# Altium footprint library SMD_Bauteile.PcbLib: 355 footprints (part 16 of 23)
Each footprint in its own frame and in the unit in brackets; x right, y up, seen from the top. Pads: shape width x height; smd on the part's side, far side on the other; paste and mask are expansions set on the pad; w line width, h text height; cw(c..) or ccw(c..) is an arc to the next point about the centre after c.
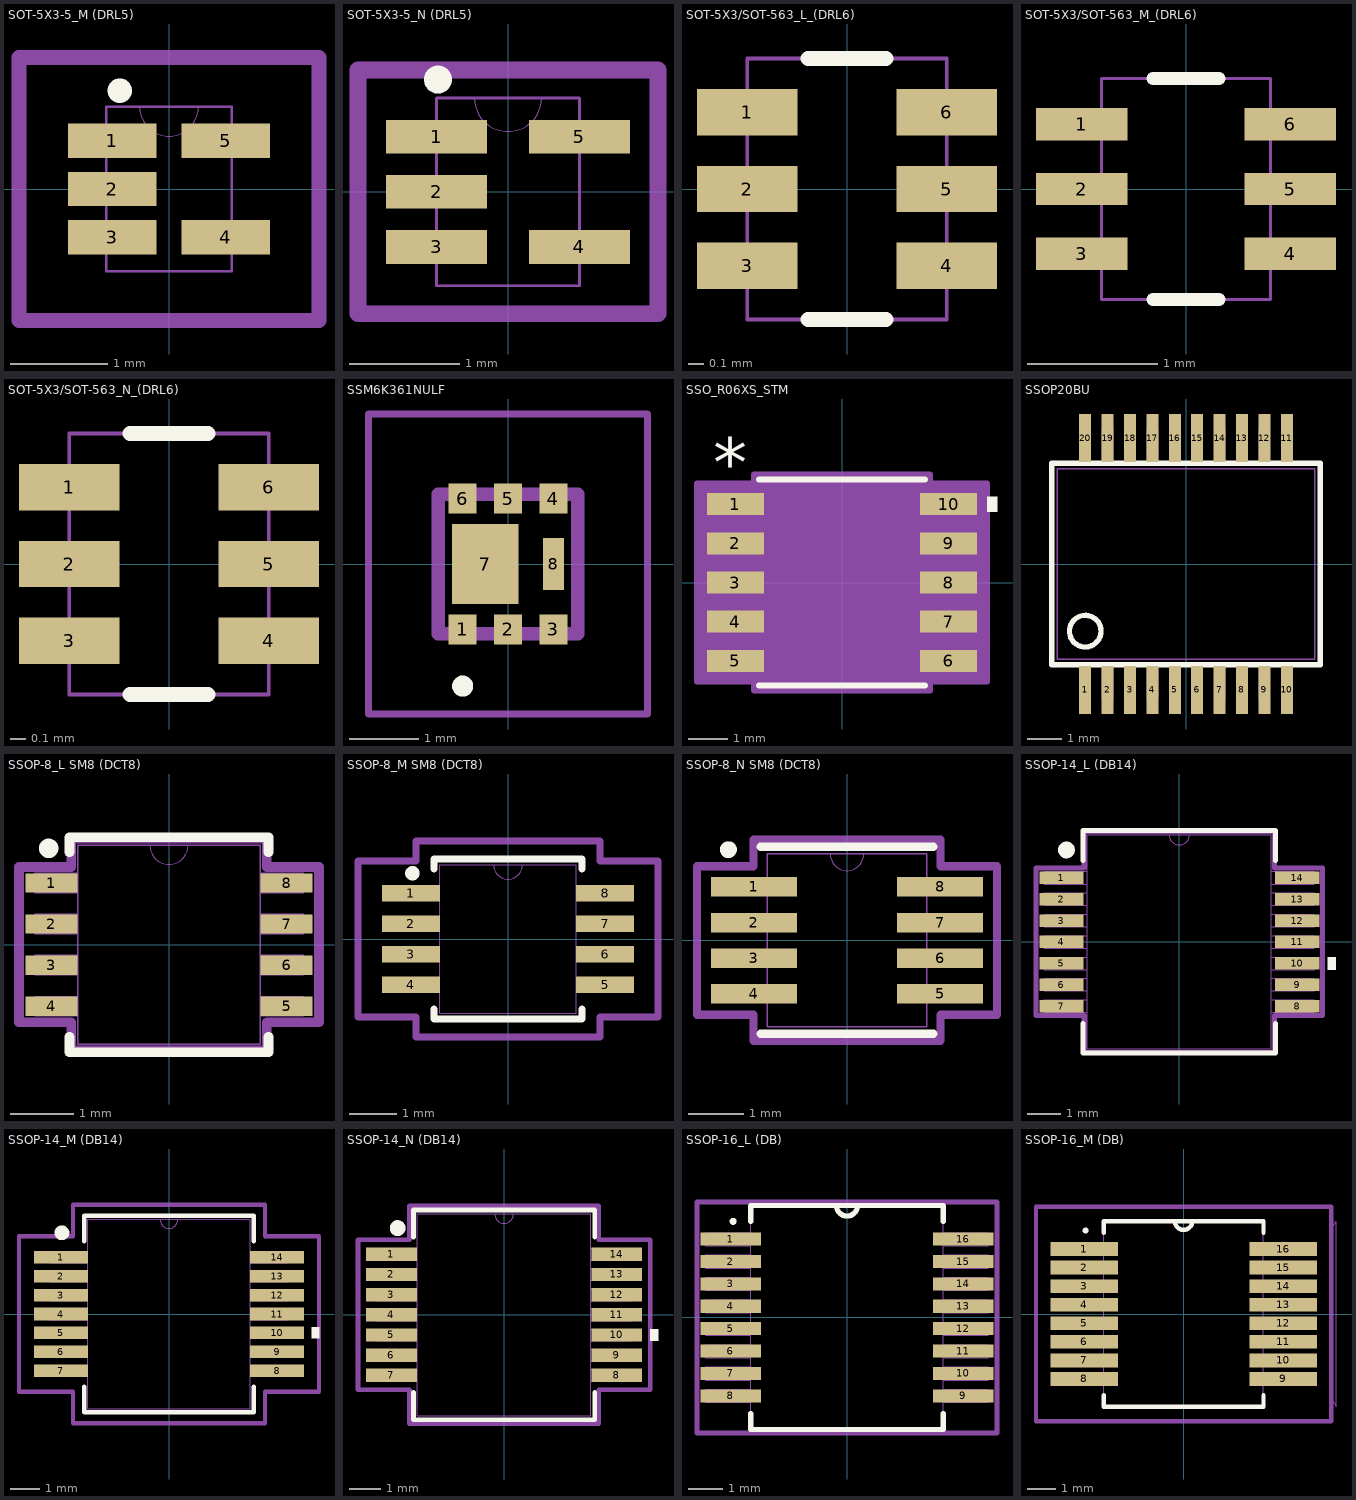
[diagram p15: the footprints below, top view; thin cyan lines are the x and y axes]

## SOT-5X3-5_M (DRL5) [mil]
height 23.62
pads (5):
  rect 36x14 smd: 1(-23,19.68) 2(-23,0) 3(-23,-19.68) 4(23,-19.68) 5(23,19.68)
Top Overlay:
  circle w10: c-20,40 r0.01
Mech Misc 1:
  lines w0: -12,33.5 ccw(c0,33.5) 12,33.5
  lines w1: -33.5,-24.68 -25.5,-24.68 -25.5,-14.69 -33.5,-14.69 -33.5,-24.68 ; -33.5,-5 -25.5,-5 -25.5,5 -33.5,5 -33.5,-5 ; -33.5,14.69 -25.5,14.69 -25.5,24.68 -33.5,24.68 -33.5,14.69 ; -25.5,-33.5 -25.5,33.5 25.5,33.5 25.5,-33.5 -25.5,-33.5 ; 25.5,-24.68 33.5,-24.68 33.5,-14.69 25.5,-14.69 25.5,-24.68 ; 25.5,14.69 33.5,14.69 33.5,24.68 25.5,24.68 25.5,14.69
Mech 15:
  lines w6: -61,-53.5 61,-53.5 61,53.5 -61,53.5 -61,-53.5
3D body "SOT-5X3-5.stp": height 23.62, standoff 0, extent -31.49,-31.49 31.5,31.51
3D body: height 10, standoff 0, extent 0,0 10,10

## SOT-5X3-5_N (DRL5) [mil]
height 23.62
pads (5):
  rect 36x12 smd: 1(-25.5,19.68) 2(-25.5,0) 3(-25.5,-19.68) 4(25.5,-19.68) 5(25.5,19.68)
Top Overlay:
  circle w10: c-25,40 r0.01
Mech Misc 1:
  lines w0: -12,33.5 ccw(c0,33.5) 12,33.5
  lines w1: -33.5,-24.68 -33.5,-14.69 -25.5,-14.69 -25.5,-24.68 -33.5,-24.68 ; -33.5,-5 -33.5,5 -25.5,5 -25.5,-5 -33.5,-5 ; -33.5,14.69 -33.5,24.68 -25.5,24.68 -25.5,14.69 -33.5,14.69 ; -25.5,-33.5 25.5,-33.5 25.5,33.5 -25.5,33.5 -25.5,-33.5 ; 25.5,-24.68 25.5,-14.69 33.5,-14.69 33.5,-24.68 25.5,-24.68 ; 25.5,14.69 25.5,24.68 33.5,24.68 33.5,14.69 25.5,14.69
Mech 15:
  lines w6: -53.5,-43.5 -53.5,43.5 53.5,43.5 53.5,-43.5 -53.5,-43.5
3D body: height 10, standoff 0, extent 0,0 10,10
3D body "SOT-5X3-5.stp": height 23.62, standoff 0, extent -31.49,-31.49 31.5,31.51

## SOT-5X3/SOT-563_L_(DRL6) [mm]
height 0.6
pads (6):
  rect 0.654x0.301 smd: 1(-0.65,0.5) 2(-0.65,0) 3(-0.65,-0.5) 4(0.65,-0.5) 5(0.65,0) 6(0.65,0.5)
Top Overlay:
  lines w0.1: -0.254,-0.85 0.254,-0.85 ; -0.254,0.85 0.254,0.85
Mech Misc 1:
  lines w0.025: -0.65,-0.85 0.65,-0.85 0.65,0.85 -0.65,0.85 -0.65,-0.85
3D body: height 0.25, standoff 0, extent 0,0 0.254,0.254
3D body "SOT-5X3_SOT-563_(DRL6).stp": height 0.6, standoff 0, extent -0.8,-0.8 0.8,0.8

## SOT-5X3/SOT-563_M_(DRL6) [mm]
height 0.6
pads (6):
  rect 0.705x0.25 smd: 1(-0.802,0.5) 2(-0.802,0) 3(-0.802,-0.5) 4(0.802,-0.5) 5(0.802,0) 6(0.802,0.5)
Top Overlay:
  lines w0.1: -0.254,-0.85 0.254,-0.85 ; -0.254,0.85 0.254,0.85
Mech Misc 1:
  lines w0.025: -0.65,-0.85 -0.65,0.85 0.65,0.85 0.65,-0.85 -0.65,-0.85
3D body: height 0.25, standoff 0, extent 0,0 0.254,0.254
3D body "SOT-5X3_SOT-563_(DRL6).stp": height 0.6, standoff 0, extent -0.8,-0.8 0.8,0.8

## SOT-5X3/SOT-563_N_(DRL6) [mm]
height 0.6
pads (6):
  rect 0.654x0.301 smd: 1(-0.65,0.5) 2(-0.65,0) 3(-0.65,-0.5) 4(0.65,-0.5) 5(0.65,0) 6(0.65,0.5)
Top Overlay:
  lines w0.1: -0.254,-0.85 0.254,-0.85 ; -0.254,0.85 0.254,0.85
Mech Misc 1:
  lines w0.025: -0.65,-0.85 0.65,-0.85 0.65,0.85 -0.65,0.85 -0.65,-0.85
3D body: height 0.25, standoff 0, extent 0,0 0.254,0.254
3D body "SOT-5X3_SOT-563_(DRL6).stp": height 0.6, standoff 0, extent -0.8,-0.8 0.8,0.8

## SSM6K361NULF [mm]
pads (8):
  rect 0.4x0.425 smd: 1(-0.65,-0.938) 2(0,-0.938) 3(0.65,-0.938) 4(0.65,0.938) 5(0,0.938) 6(-0.65,0.938)
  rect 0.95x1.15 smd: 7(-0.325,0)
  rect 0.3x0.75 smd: 8(0.65,0)
Top Overlay:
  lines w0.2: -0.65,-1.8 ccw(c-0.65,-1.75) -0.65,-1.7 ; -0.65,-1.8 cw(c-0.65,-1.75) -0.65,-1.7 ; -0.65,-1.8 ccw(c-0.65,-1.75) -0.65,-1.7
Mech 15:
  lines w0.2: -1,-1 -1,1 1,1 1,-1 -1,-1
Top 3D Body:
  lines w0.1: -2,-2.15 -2,2.15 2,2.15 2,-2.15 -2,-2.15

## SSO_R06XS_STM [mm]
pads (10):
  rect 1.455x0.558 smd paste+0 mask+0: 1(-2.721,2) 2(-2.721,1) 3(-2.721,0) 4(-2.721,-1) 5(-2.721,-2) 6(2.721,-2) 7(2.721,-1) 8(2.721,0) 9(2.721,1) 10(2.721,2)
Top Overlay:
  region: 3.703,2.19 3.957,2.19 3.957,1.809 3.703,1.809
  lines w0.152: -2.121,-2.629 2.121,-2.629 ; -2.121,2.629 2.121,2.629
  text "*" at -3.293,2.431 h1.27
Mech Misc 1:
  lines w0: -0.305,2.502 ccw(c0,2.502) 0.305,2.502
  lines w0.025: -3.099,-2.254 -1.994,-2.254 -1.994,-1.746 -3.099,-1.746 -3.099,-2.254 ; -3.099,-1.254 -1.994,-1.254 -1.994,-0.746 -3.099,-0.746 -3.099,-1.254 ; -3.099,-0.254 -1.994,-0.254 -1.994,0.254 -3.099,0.254 -3.099,-0.254 ; -3.099,0.746 -1.994,0.746 -1.994,1.254 -3.099,1.254 -3.099,0.746 ; -3.099,1.746 -1.994,1.746 -1.994,2.254 -3.099,2.254 -3.099,1.746 ; -1.994,-2.502 -1.994,2.502 1.994,2.502 1.994,-2.502 -1.994,-2.502 ; 1.994,-2.254 3.099,-2.254 3.099,-1.746 1.994,-1.746 1.994,-2.254 ; 1.994,-1.254 3.099,-1.254 3.099,-0.746 1.994,-0.746 1.994,-1.254 ; 1.994,-0.254 3.099,-0.254 3.099,0.254 1.994,0.254 1.994,-0.254 ; 1.994,0.746 3.099,0.746 3.099,1.254 1.994,1.254 1.994,0.746 ; 1.994,1.746 3.099,1.746 3.099,2.254 1.994,2.254 1.994,1.746
  text "*" at -1.93,1.156 h1.27
Mech 15:
  region: -2.248,-2.533 -3.703,-2.533 -3.703,2.533 -2.248,2.533 -2.248,2.756 2.248,2.756 2.248,2.533 3.703,2.533 3.703,-2.533 2.248,-2.533 2.248,-2.756 -2.248,-2.756
  lines w0.152: -3.703,-2.533 -2.248,-2.533 -2.248,-2.756 2.248,-2.756 2.248,-2.533 3.703,-2.533 3.703,2.533 2.248,2.533 2.248,2.756 -2.248,2.756 -2.248,2.533 -3.703,2.533 -3.703,-2.533
3D body "SSO_R06XS_STM.step": height 1.76, standoff 0, extent -3.099,-2.502 3.099,2.502

## SSOP20BU [mm]
pads (20):
  rect 0.348x1.397 smd: 1(-2.925,-3.656) 2(-2.275,-3.656) 3(-1.625,-3.656) 4(-0.975,-3.656) 5(-0.325,-3.656) 6(0.325,-3.656) 7(0.975,-3.656) 8(1.625,-3.656) 9(2.275,-3.656) 10(2.925,-3.656) 11(2.925,3.656) 12(2.275,3.656) 13(1.625,3.656) 14(0.975,3.656) 15(0.325,3.656) 16(-0.325,3.656) 17(-0.975,3.656) 18(-1.625,3.656) 19(-2.275,3.656) 20(-2.925,3.656)
Top Overlay:
  circle w0.152: c-2.925,-1.95 r0.46
  lines w0.152: -3.9,-2.925 3.9,-2.925 3.9,2.925 -3.9,2.925 -3.9,-2.925
Mech Misc 1:
  region: -2.762,2.967 -3.089,2.967 -3.089,3.9 -2.762,3.9
  region: -2.762,-3.903 -3.09,-3.903 -3.09,-2.966 -2.762,-2.966
  region: -2.113,-3.902 -2.439,-3.902 -2.439,-2.966 -2.113,-2.966
  region: -1.462,-3.907 -1.791,-3.907 -1.791,-2.966 -1.462,-2.966
  region: -2.113,2.97 -2.441,2.97 -2.441,3.9 -2.113,3.9
  region: -1.462,2.969 -1.79,2.969 -1.79,3.9 -1.462,3.9
  region: -0.813,2.97 -1.139,2.97 -1.139,3.9 -0.813,3.9
  region: -0.162,2.971 -0.488,2.971 -0.488,3.9 -0.162,3.9
  region: 0.487,2.968 0.163,2.968 0.163,3.9 0.487,3.9
  region: 1.138,2.968 0.813,2.968 0.813,3.9 1.138,3.9
  region: 1.787,2.971 1.465,2.971 1.465,3.9 1.787,3.9
  region: 2.438,2.966 2.113,2.966 2.113,3.9 2.438,3.9
  region: 3.087,2.967 2.764,2.967 2.764,3.9 3.087,3.9
  region: -0.813,-3.902 -1.138,-3.902 -1.138,-2.966 -0.813,-2.966
  region: -0.162,-3.902 -0.488,-3.902 -0.488,-2.966 -0.162,-2.966
  region: 0.487,-3.901 0.163,-3.901 0.163,-2.966 0.487,-2.966
  region: 1.138,-3.904 0.813,-3.904 0.813,-2.966 1.138,-2.966
  region: 1.787,-3.904 1.464,-3.904 1.464,-2.966 1.787,-2.966
  region: 2.438,-3.906 2.116,-3.906 2.116,-2.966 2.438,-2.966
  region: 3.087,-3.904 2.766,-3.904 2.766,-2.966 3.087,-2.966
  lines w0.051: -3.738,-2.763 3.738,-2.763 3.738,2.763 -3.738,2.763 -3.738,-2.763

## SSOP-8_L SM8 (DCT8) [mil]
height 51.18
pads (8):
  rect 32.5x12 smd paste+0 mask+0: 1(-73.25,38.39) 2(-73.25,12.8) 3(-73.25,-12.8) 4(-73.25,-38.39) 5(73.25,-38.39) 6(73.25,-12.8) 7(73.25,12.8) 8(73.25,38.39)
Top Overlay:
  circle w10: c-75,60 r1
  lines w6: -62,-57.49 -62,-67 62,-67 62,-57.49 ; -62,57.49 -62,67 62,67 62,57.49
Mech Misc 1:
  lines w0: -12,62 ccw(c0,62) 12,62
  lines w1: -83.5,-44.39 -83.5,-32.39 -57,-32.39 -57,-44.39 -83.5,-44.39 ; -83.5,-18.8 -83.5,-6.8 -57,-6.8 -57,-18.8 -83.5,-18.8 ; -83.5,6.8 -83.5,18.8 -57,18.8 -57,6.8 -83.5,6.8 ; -83.5,32.39 -83.5,44.39 -57,44.39 -57,32.39 -83.5,32.39 ; -57,-62 57,-62 57,62 -57,62 -57,-62 ; 57,-44.39 57,-32.39 83.5,-32.39 83.5,-44.39 57,-44.39 ; 57,-18.8 57,-6.8 83.5,-6.8 83.5,-18.8 57,-18.8 ; 57,6.8 57,18.8 83.5,18.8 83.5,6.8 57,6.8 ; 57,32.39 57,44.39 83.5,44.39 83.5,32.39 57,32.39
Mech 15:
  lines w6: -93.5,-48.39 -93.5,48.39 -61,48.39 -61,66 61,66 61,48.39 93.5,48.39 93.5,-48.39 61,-48.39 61,-66 -61,-66 -61,-48.39 -93.5,-48.39
3D body: height 10, standoff 0, extent 0,0 10,10
3D body "DCT8.step": height 51.1, standoff 0, extent -83.5,-62 83.51,62.01

## SSOP-8_M SM8 (DCT8) [mil]
height 51.18
pads (8):
  rect 48.5x14 smd paste+0 mask+0: 1(-81.25,38.39) 2(-81.25,12.8) 3(-81.25,-12.8) 4(-81.25,-38.39) 5(81.25,-38.39) 6(81.25,-12.8) 7(81.25,12.8) 8(81.25,38.39)
Top Overlay:
  circle w10: c-80,55 r1
  lines w6: -62,-58.49 -62,-67 62,-67 62,-58.49 ; -62,58.49 -62,67 62,67 62,58.49
Mech Misc 1:
  lines w0: -12,62 ccw(c0,62) 12,62
  lines w1: -83.5,-44.39 -57,-44.39 -57,-32.39 -83.5,-32.39 -83.5,-44.39 ; -83.5,-18.8 -57,-18.8 -57,-6.8 -83.5,-6.8 -83.5,-18.8 ; -83.5,6.8 -57,6.8 -57,18.8 -83.5,18.8 -83.5,6.8 ; -83.5,32.39 -57,32.39 -57,44.39 -83.5,44.39 -83.5,32.39 ; -57,-62 -57,62 57,62 57,-62 -57,-62 ; 57,-44.39 83.5,-44.39 83.5,-32.39 57,-32.39 57,-44.39 ; 57,-18.8 83.5,-18.8 83.5,-6.8 57,-6.8 57,-18.8 ; 57,6.8 83.5,6.8 83.5,18.8 57,18.8 57,6.8 ; 57,32.39 83.5,32.39 83.5,44.39 57,44.39 57,32.39
Mech 15:
  lines w6: -125.5,-65.39 -77,-65.39 -77,-82 77,-82 77,-65.39 125.5,-65.39 125.5,65.39 77,65.39 77,82 -77,82 -77,65.39 -125.5,65.39 -125.5,-65.39
3D body: height 10, standoff 0, extent 0,0 10,10
3D body "DCT8.step": height 51.1, standoff 0, extent -83.5,-62 83.51,62.01

## SSOP-8_N SM8 (DCT8) [mil]
height 51.18
pads (8):
  rect 61.5x14 smd: 1(-66.75,38.39) 2(-66.75,12.8) 3(-66.75,-12.8) 4(-66.75,-38.39) 5(66.75,-38.39) 6(66.75,-12.8) 7(66.75,12.8) 8(66.75,38.39)
Top Overlay:
  circle w10: c-85,65 r1
  lines w6: -62,-67 62,-67 ; -62,67 62,67
Mech Misc 1:
  lines w0: -12,62 ccw(c0,62) 12,62
  lines w1: -83.5,-44.39 -83.5,-32.39 -57,-32.39 -57,-44.39 -83.5,-44.39 ; -83.5,-18.8 -83.5,-6.8 -57,-6.8 -57,-18.8 -83.5,-18.8 ; -83.5,6.8 -83.5,18.8 -57,18.8 -57,6.8 -83.5,6.8 ; -83.5,32.39 -83.5,44.39 -57,44.39 -57,32.39 -83.5,32.39 ; -57,-62 57,-62 57,62 -57,62 -57,-62 ; 57,-44.39 57,-32.39 83.5,-32.39 83.5,-44.39 57,-44.39 ; 57,-18.8 57,-6.8 83.5,-6.8 83.5,-18.8 57,-18.8 ; 57,6.8 57,18.8 83.5,18.8 83.5,6.8 57,6.8 ; 57,32.39 57,44.39 83.5,44.39 83.5,32.39 57,32.39
Mech 15:
  lines w6: -107.5,-53.18 -107.5,53.18 -67,53.18 -67,72 67,72 67,53.18 107.5,53.18 107.5,-53.18 67,-53.18 67,-72 -67,-72 -67,-53.18 -107.5,-53.18
3D body: height 10, standoff 0, extent 0,0 10,10
3D body "DCT8.step": height 51.1, standoff 0, extent -83.5,-62 83.51,62.01

## SSOP-14_L (DB14) [mil]
height 78.74
pads (14):
  rect 52.75x15 smd paste+0 mask+0: 1(-141.03,76.77) 2(-141.03,51.18) 3(-141.03,25.59) 4(-141.03,0) 5(-141.03,-25.59) 6(-141.03,-51.18) 7(-141.03,-76.77) 8(141.03,-76.77) 9(141.03,-51.18) 10(141.03,-25.59) 11(141.03,0) 12(141.03,25.59) 13(141.03,51.18) 14(141.03,76.77)
Top Overlay:
  circle w10: c-135,110 r5
  region: 177.41,-18.09 187.41,-18.09 187.41,-33.09 177.41,-33.09
  lines w6: -115,-97.37 -115,-133 115,-133 115,-97.37 ; -115,97.37 -115,133 115,133 115,97.37
Mech Misc 1:
  lines w0: -12,128 ccw(c0,128) 12,128
  lines w1: -161.5,-84.27 -161.5,-69.27 -110,-69.27 -110,-84.27 -161.5,-84.27 ; -161.5,-58.68 -161.5,-43.68 -110,-43.68 -110,-58.68 -161.5,-58.68 ; -161.5,-33.09 -161.5,-18.09 -110,-18.09 -110,-33.09 -161.5,-33.09 ; -161.5,-7.5 -161.5,7.5 -110,7.5 -110,-7.5 -161.5,-7.5 ; -161.5,18.09 -161.5,33.09 -110,33.09 -110,18.09 -161.5,18.09 ; -161.5,43.68 -161.5,58.68 -110,58.68 -110,43.68 -161.5,43.68 ; -161.5,69.27 -161.5,84.27 -110,84.27 -110,69.27 -161.5,69.27 ; -110,-128 110,-128 110,128 -110,128 -110,-128 ; 110,-84.27 110,-69.27 161.5,-69.27 161.5,-84.27 110,-84.27 ; 110,-58.68 110,-43.68 161.5,-43.68 161.5,-58.68 110,-58.68 ; 110,-33.09 110,-18.09 161.5,-18.09 161.5,-33.09 110,-33.09 ; 110,-7.5 110,7.5 161.5,7.5 161.5,-7.5 110,-7.5 ; 110,18.09 110,33.09 161.5,33.09 161.5,18.09 110,18.09 ; 110,43.68 110,58.68 161.5,58.68 161.5,43.68 110,43.68 ; 110,69.27 110,84.27 161.5,84.27 161.5,69.27 110,69.27
Mech 15:
  lines w6: -171.41,-88.27 -171.41,88.27 -114,88.27 -114,132 114,132 114,88.27 171.41,88.27 171.41,-88.27 114,-88.27 114,-132 -114,-132 -114,-88.27 -171.41,-88.27
3D body: height 10, standoff 0, extent 0,0 10,10
3D body "DB14.step": height 79.09, standoff 0, extent -161.5,-127.99 161.5,128

## SSOP-14_M (DB14) [mm]
height 2
pads (14):
  rect 1.858x0.431 smd paste+0 mask+0: 1(-3.723,1.95) 2(-3.723,1.3) 3(-3.723,0.65) 4(-3.723,0) 5(-3.723,-0.65) 6(-3.723,-1.3) 7(-3.723,-1.95) 8(3.723,-1.95) 9(3.723,-1.3) 10(3.723,-0.65) 11(3.723,0) 12(3.723,0.65) 13(3.723,1.3) 14(3.723,1.95)
Top Overlay:
  circle w0.254: c-3.683,2.794 r0.127
  region: 4.906,-0.459 5.16,-0.459 5.16,-0.84 4.906,-0.84
  lines w0.152: -2.921,-2.498 -2.921,-3.378 2.921,-3.378 2.921,-2.498 ; -2.921,2.498 -2.921,3.378 2.921,3.378 2.921,2.498
Mech Misc 1:
  lines w0: -0.305,3.251 ccw(c0,3.251) 0.305,3.251
  lines w0.025: -4.102,-2.14 -4.102,-1.759 -2.794,-1.759 -2.794,-2.14 -4.102,-2.14 ; -4.102,-1.49 -4.102,-1.109 -2.794,-1.109 -2.794,-1.49 -4.102,-1.49 ; -4.102,-0.84 -4.102,-0.459 -2.794,-0.459 -2.794,-0.84 -4.102,-0.84 ; -4.102,-0.191 -4.102,0.191 -2.794,0.191 -2.794,-0.191 -4.102,-0.191 ; -4.102,0.459 -4.102,0.84 -2.794,0.84 -2.794,0.459 -4.102,0.459 ; -4.102,1.109 -4.102,1.49 -2.794,1.49 -2.794,1.109 -4.102,1.109 ; -4.102,1.76 -4.102,2.141 -2.794,2.141 -2.794,1.76 -4.102,1.76 ; -2.794,-3.251 2.794,-3.251 2.794,3.251 -2.794,3.251 -2.794,-3.251 ; 2.794,-2.141 2.794,-1.76 4.102,-1.76 4.102,-2.141 2.794,-2.141 ; 2.794,-1.49 2.794,-1.109 4.102,-1.109 4.102,-1.49 2.794,-1.49 ; 2.794,-0.841 2.794,-0.46 4.102,-0.46 4.102,-0.841 2.794,-0.841 ; 2.794,-0.191 2.794,0.191 4.102,0.191 4.102,-0.191 2.794,-0.191 ; 2.794,0.459 2.794,0.84 4.102,0.84 4.102,0.459 2.794,0.459 ; 2.794,1.109 2.794,1.49 4.102,1.49 4.102,1.109 2.794,1.109 ; 2.794,1.759 2.794,2.14 4.102,2.14 4.102,1.759 2.794,1.759
Mech 15:
  lines w0.152: -5.16,-2.673 -5.16,2.673 -3.302,2.673 -3.302,3.759 3.302,3.759 3.302,2.673 5.16,2.673 5.16,-2.673 3.302,-2.673 3.302,-3.759 -3.302,-3.759 -3.302,-2.673 -5.16,-2.673
3D body: height 0.25, standoff 0, extent 0,0 0.254,0.254
3D body "DB14.step": height 2.01, standoff 0, extent -4.102,-3.251 4.102,3.251

## SSOP-14_N (DB14) [mil]
height 78.74
pads (14):
  rect 64.56x16.97 smd paste+0 mask+0: 1(-143,76.77) 2(-143,51.18) 3(-143,25.59) 4(-143,0) 5(-143,-25.59) 6(-143,-51.18) 7(-143,-76.77) 8(143,-76.77) 9(143,-51.18) 10(143,-25.59) 11(143,0) 12(143,25.59) 13(143,51.18) 14(143,76.77)
Top Overlay:
  circle w10: c-135,110 r5
  region: 185.28,-18.09 195.28,-18.09 195.28,-33.09 185.28,-33.09
  lines w6: -115,-98.36 -115,-133 115,-133 115,-98.36 ; -115,98.36 -115,133 115,133 115,98.36
Mech Misc 1:
  lines w0: -12,128 ccw(c0,128) 12,128
  lines w1: -161.5,-84.27 -161.5,-69.27 -110,-69.27 -110,-84.27 -161.5,-84.27 ; -161.5,-58.68 -161.5,-43.68 -110,-43.68 -110,-58.68 -161.5,-58.68 ; -161.5,-33.09 -161.5,-18.09 -110,-18.09 -110,-33.09 -161.5,-33.09 ; -161.5,-7.5 -161.5,7.5 -110,7.5 -110,-7.5 -161.5,-7.5 ; -161.5,18.09 -161.5,33.09 -110,33.09 -110,18.09 -161.5,18.09 ; -161.5,43.68 -161.5,58.68 -110,58.68 -110,43.68 -161.5,43.68 ; -161.5,69.27 -161.5,84.27 -110,84.27 -110,69.27 -161.5,69.27 ; -110,-128 110,-128 110,128 -110,128 -110,-128 ; 110,-84.27 110,-69.27 161.5,-69.27 161.5,-84.27 110,-84.27 ; 110,-58.68 110,-43.68 161.5,-43.68 161.5,-58.68 110,-58.68 ; 110,-33.09 110,-18.09 161.5,-18.09 161.5,-33.09 110,-33.09 ; 110,-7.5 110,7.5 161.5,7.5 161.5,-7.5 110,-7.5 ; 110,18.09 110,33.09 161.5,33.09 161.5,18.09 110,18.09 ; 110,43.68 110,58.68 161.5,58.68 161.5,43.68 110,43.68 ; 110,69.27 110,84.27 161.5,84.27 161.5,69.27 110,69.27
Mech 15:
  lines w6: -185.28,-95.26 -185.28,95.26 -120,95.26 -120,138 120,138 120,95.26 185.28,95.26 185.28,-95.26 120,-95.26 120,-138 -120,-138 -120,-95.26 -185.28,-95.26
3D body: height 10, standoff 0, extent 0,0 10,10
3D body "DB14.step": height 79.09, standoff 0, extent -161.49,-127.99 161.5,128

## SSOP-16_L (DB) [mil]
height 78.74
pads (16):
  rect 69x15 smd: 1(-133,89.57) 2(-133,63.98) 3(-133,38.39) 4(-133,12.8) 5(-133,-12.8) 6(-133,-38.39) 7(-133,-63.98) 8(-133,-89.57) 9(133,-89.57) 10(133,-63.98) 11(133,-38.39) 12(133,-12.8) 13(133,12.8) 14(133,38.39) 15(133,63.98) 16(133,89.57)
Top Overlay:
  circle w7.87: c-130.1,110 r0.1
  lines w6: -110,-110.17 -110,-128 110,-128 110,-110.17 ; -110,110.17 -110,128 110,128 110,110.17 ; -12,128 ccw(c0,128) 12,128
Mech Misc 1:
  lines w0: -12,128 ccw(c0,128) 12,128
  lines w1: -161.5,-97.07 -161.5,-82.07 -110,-82.07 -110,-97.07 -161.5,-97.07 ; -161.5,-71.48 -161.5,-56.48 -110,-56.48 -110,-71.48 -161.5,-71.48 ; -161.5,-45.89 -161.5,-30.89 -110,-30.89 -110,-45.89 -161.5,-45.89 ; -161.5,-20.3 -161.5,-5.3 -110,-5.3 -110,-20.3 -161.5,-20.3 ; -161.5,5.3 -161.5,20.3 -110,20.3 -110,5.3 -161.5,5.3 ; -161.5,30.89 -161.5,45.89 -110,45.89 -110,30.89 -161.5,30.89 ; -161.5,56.48 -161.5,71.48 -110,71.48 -110,56.48 -161.5,56.48 ; -161.5,82.07 -161.5,97.07 -110,97.07 -110,82.07 -161.5,82.07 ; -110,-128 110,-128 110,128 -110,128 -110,-128 ; 110,-97.07 110,-82.07 161.5,-82.07 161.5,-97.07 110,-97.07 ; 110,-71.48 110,-56.48 161.5,-56.48 161.5,-71.48 110,-71.48 ; 110,-45.89 110,-30.89 161.5,-30.89 161.5,-45.89 110,-45.89 ; 110,-20.3 110,-5.3 161.5,-5.3 161.5,-20.3 110,-20.3 ; 110,5.3 110,20.3 161.5,20.3 161.5,5.3 110,5.3 ; 110,30.89 110,45.89 161.5,45.89 161.5,30.89 110,30.89 ; 110,56.48 110,71.48 161.5,71.48 161.5,56.48 110,56.48 ; 110,82.07 110,97.07 161.5,97.07 161.5,82.07 110,82.07
Mech 15:
  lines w6: -171.5,-132 -171.5,132 171.5,132 171.5,-132 -171.5,-132
3D body "SSOP-16 (DB).stp": height 74.8, standoff 0, extent -153.54,-122.04 153.55,122.05

## SSOP-16_M (DB) [mil]
height 78.74
pads (16):
  rect 93x19 smd: 1(-137,89.57) 2(-137,63.98) 3(-137,38.39) 4(-137,12.8) 5(-137,-12.8) 6(-137,-38.39) 7(-137,-63.98) 8(-137,-89.57) 9(137,-89.57) 10(137,-63.98) 11(137,-38.39) 12(137,-12.8) 13(137,12.8) 14(137,38.39) 15(137,63.98) 16(137,89.57)
Top Overlay:
  circle w7.87: c-135.1,115 r0.1
  lines w6: -110,-112.17 -110,-128 110,-128 110,-112.17 ; -110,112.17 -110,128 110,128 110,112.17 ; -12,128 ccw(c0,128) 12,128
Top Courtyard:
  lines w1: 205,-118 210,-128 210,128 205,118
Mech Misc 1:
  lines w0: -12,128 ccw(c0,128) 12,128
  lines w1: -161.5,-97.07 -110,-97.07 -110,-82.07 -161.5,-82.07 -161.5,-97.07 ; -161.5,-71.48 -110,-71.48 -110,-56.48 -161.5,-56.48 -161.5,-71.48 ; -161.5,-45.89 -110,-45.89 -110,-30.89 -161.5,-30.89 -161.5,-45.89 ; -161.5,-20.3 -110,-20.3 -110,-5.3 -161.5,-5.3 -161.5,-20.3 ; -161.5,5.3 -110,5.3 -110,20.3 -161.5,20.3 -161.5,5.3 ; -161.5,30.89 -110,30.89 -110,45.89 -161.5,45.89 -161.5,30.89 ; -161.5,56.48 -110,56.48 -110,71.48 -161.5,71.48 -161.5,56.48 ; -161.5,82.07 -110,82.07 -110,97.07 -161.5,97.07 -161.5,82.07 ; -110,-128 -110,128 110,128 110,-128 -110,-128 ; 110,-97.07 161.5,-97.07 161.5,-82.07 110,-82.07 110,-97.07 ; 110,-71.48 161.5,-71.48 161.5,-56.48 110,-56.48 110,-71.48 ; 110,-45.89 161.5,-45.89 161.5,-30.89 110,-30.89 110,-45.89 ; 110,-20.3 161.5,-20.3 161.5,-5.3 110,-5.3 110,-20.3 ; 110,5.3 161.5,5.3 161.5,20.3 110,20.3 110,5.3 ; 110,30.89 161.5,30.89 161.5,45.89 110,45.89 110,30.89 ; 110,56.48 161.5,56.48 161.5,71.48 110,71.48 110,56.48 ; 110,82.07 161.5,82.07 161.5,97.07 110,97.07 110,82.07
Mech 15:
  lines w6: -203.5,-148 203.5,-148 203.5,148 -203.5,148 -203.5,-148
3D body "SSOP-16 (DB).stp": height 74.8, standoff 0, extent -153.54,-122.04 153.55,122.05